# Altium footprint library MH_DA_THU_VIEN_16122016.PcbLib: 531 footprints (part 31 of 34)
Each footprint in its own frame and in the unit in brackets; x right, y up, seen from the top. Pads: shape width x height; smd on the part's side, far side on the other; paste and mask are expansions set on the pad; w line width, h text height; cw(c..) or ccw(c..) is an arc to the next point about the centre after c.
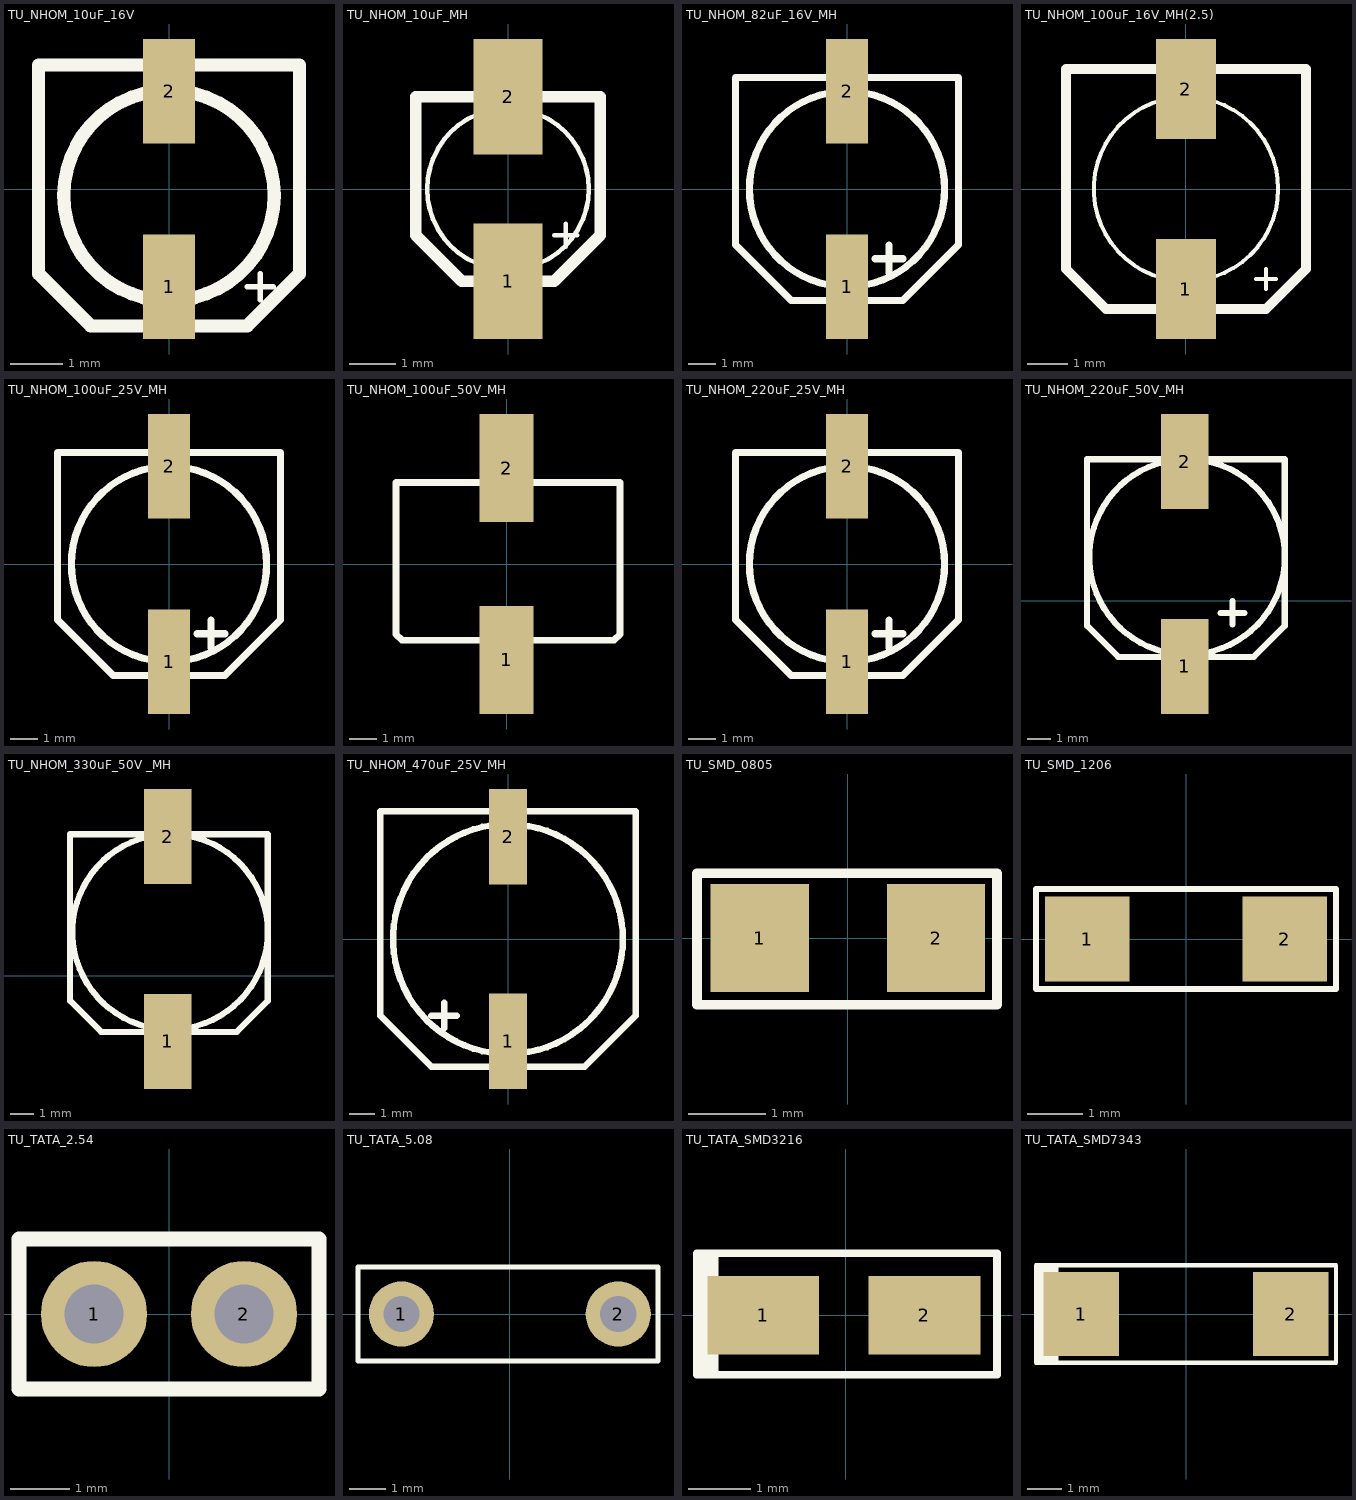
[diagram p30: the footprints below, top view; thin cyan lines are the x and y axes]

## TU_NHOM_10uF_16V [mm]
pads (2):
  rect 1x2 smd: 1(0,-1.875) 2(0,1.875)
Top Overlay:
  circle w0.254: c0,-0.125 r2.016
  lines w0.1: 1.5,-1.875 2,-1.875 ; 1.75,-2.125 1.75,-1.625
  lines w0.254: -2.5,-1.625 -2.5,2.375 2.5,2.375 2.5,-1.625 1.5,-2.625 -1.5,-2.625 -2.5,-1.625
3D body: height 5.4, standoff -0.05, extent -2.15,-2.625 2.15,2.375

## TU_NHOM_10uF_MH [mm]
pads (2):
  rect 1.5x2.5 smd: 1(0,-2) 2(0,2)
Top Overlay:
  circle w0.1: c0,0 r1.75
  lines w0.1: 1,-1 1.5,-1 ; 1.25,-1.25 1.25,-1 1.25,-0.75
  lines w0.254: -2,-1 -2,2 2,2 2,-1 1,-2 -1,-2 -2,-1
3D body: height 5.4, standoff -0.05, extent -2.15,-2.5 2.15,2.5

## TU_NHOM_82uF_16V_MH [mm]
pads (2):
  rect 1.5x3.75 smd: 1(0,-3.5) 2(0,3.5)
Top Overlay:
  circle w0.254: c0,0 r3.5
  lines w0.254: 1,-2.5 2,-2.5 ; 1.5,-3 1.5,-2 ; 2,-4 -2,-4 -4,-2 -4,4 4,4 4,-2 2,-4 ; 2,-4 2,-4
3D body: height 11.23, standoff -0.2, extent -4.15,-5 4.15,4

## TU_NHOM_100uF_16V_MH(2.5) [mm]
pads (2):
  rect 1.5x2.5 smd: 1(0,-2.5) 2(0,2.5)
Top Overlay:
  circle w0.1: c0,0 r2.305
  lines w0.1: 1.75,-2.25 2.25,-2.25 ; 2,-2.5 2,-2
  lines w0.254: -3,-2 -2,-3 2,-3 3,-2 3,3 -3,3 -3,-2
3D body: height 6, standoff 0, extent -3.25,-3.3 3.35,3.3

## TU_NHOM_100uF_25V_MH [mm]
pads (2):
  rect 1.5x3.75 smd: 1(0,-3.5) 2(0,3.5)
Top Overlay:
  circle w0.254: c0,0 r3.5
  lines w0.254: 1,-2.5 2,-2.5 ; 1.5,-3 1.5,-2 ; 2,-4 4,-2 4,4 -4,4 -4,-2 -2,-4 2,-4 ; 2,-4 2,-4
3D body: height 11.23, standoff -0.2, extent -4.15,-5 4.15,4

## TU_NHOM_100uF_50V_MH [mm]
pads (2):
  rect 2x4 smd: 1(0,-3.55) 2(0,3.551)
Top Overlay:
  lines w0.254: -4.1,-2.601 -4.1,-2.501 ; -4.1,-2.601 -3.881,-2.819 -0.971,-2.819 3.981,-2.819 4.2,-2.601 4.2,3.023 -4.1,3.023 -4.1,-2.501 ; -4.1,-2.601 -4.1,-2.501
3D body: height 7.9, standoff -0.05, extent -5.105,-5.652 5.195,5.348

## TU_NHOM_220uF_25V_MH [mm]
pads (2):
  rect 1.5x3.75 smd: 1(0,-3.5) 2(0,3.5)
Top Overlay:
  circle w0.254: c0,0 r3.5
  lines w0.254: 1,-2.5 2,-2.5 ; 1.5,-3 1.5,-2 ; 2,-4 -2,-4 -4,-2 -4,4 4,4 4,-2 2,-4 ; 2,-4 2,-4
3D body: height 11.23, standoff -0.2, extent -4.15,-5 4.15,4

## TU_NHOM_220uF_50V_MH [mm]
pads (2):
  rect 2x4 smd: 1(17.989,-2.751) 2(17.989,5.849)
Top Overlay:
  circle w0.254: c18.089,1.849 r4.105
  lines w0.254: 15.289,-2.351 15.189,-2.351 ; 19.5,-0.5 20.5,-0.5 ; 20,-1 20,0 ; 15.189,-2.351 20.889,-2.351 22.189,-1.051 22.189,5.949 13.889,5.949 13.889,-0.951 13.889,-1.051 15.189,-2.351
3D body: height 7.9, standoff -0.05, extent 12.803,-3.66 23.103,7.34

## TU_NHOM_330uF_50V _MH [mm]
pads (2):
  rect 2x4 smd: 1(17.989,-2.751) 2(17.989,5.849)
Top Overlay:
  circle w0.254: c18.089,1.849 r4.105
  lines w0.254: 15.289,-2.351 15.189,-2.351 ; 15.189,-2.351 20.889,-2.351 22.189,-1.051 22.189,5.949 13.889,5.949 13.889,-0.951 13.889,-1.051 15.189,-2.351
3D body: height 7.9, standoff -0.05, extent 12.803,-3.66 23.103,7.34

## TU_NHOM_470uF_25V_MH [mm]
pads (2):
  rect 1.5x3.75 smd: 1(0,-4) 2(0,4)
Top Overlay:
  circle w0.254: c0,0 r4.5
  lines w0.254: -3,-3 -2,-3 ; -2.5,-3.5 -2.5,-3 -2.5,-2.5 ; -3,-5 -5,-3 -5,5 5,5 5,-3 3,-5 ; -3,-5 3,-5 ; -3,-5 3,-5
3D body: height 7.9, standoff -0.05, extent -5.15,-5.5 5.15,5.5

## TU_SMD_0805 [mil]
height 50
pads (2):
  rect 50x55 smd: 1(-45,0) 2(45,0)
Top Overlay:
  lines w5: -77,-34 -77,33 76,33 76,-34 -77,-34
3D body: height 24.02, standoff -0.39, extent -39.76,-27 39.77,23

## TU_SMD_1206 [mil]
pads (2):
  rect 60x60 smd: 1(-70,0) 2(70,0)
Top Overlay:
  lines w3.94: -106.3,-35.43 -106.3,35.43 106.3,35.43 106.3,32.17 106.3,-35.43 -106.3,-35.43
3D body: height 40, standoff 0, extent -35,-35 35,35
3D body: height 39.45, standoff 0, extent -62.99,-31.49 63,31.5

## TU_TATA_2.54 [mm]
pads (2):
  round 1.8 hole 1: 1(-1.27,0) 2(1.27,0)
Top Overlay:
  lines w0.254: -2.54,-1.27 -2.54,1.27 2.54,1.27 2.54,-1.27 -2.54,-1.27
3D body: height 8.84, standoff -0.5, extent -1.905,-1.27 1.905,1.27

## TU_TATA_5.08 [mm]
pads (2):
  round 1.8 hole 1: 1(-3,0) 2(3,0)
Top Overlay:
  lines w0.127: -4.2,-1.3 -4.2,1.3 4.1,1.3 4.1,-1.3 -4.2,-1.3
3D body: height 6.27, standoff -0.47, extent -2.794,-1.159 2.794,1

## TU_TATA_SMD3216 [mm]
pads (2):
  rect 1.8x1.27 smd: 1(-1.33,0) 2(1.27,0)
Top Overlay:
  rectangle: -2.4,-0.96 -2.1,1
  lines w0.1: -2.1,-0.96 -2.1,1
  lines w0.127: -2.4,-0.96 2.44,-0.96 2.44,0.7 2.44,1 -2.4,1 -2.4,-0.96
3D body: height 1.7, standoff 0, extent -1.7,-0.9 1.7,0.9

## TU_TATA_SMD7343 [mm]
pads (2):
  rect 2.16x2.41 smd: 1(-3,0) 2(3,0)
Top Overlay:
  rectangle: -4.3,-1.4 -3.7,1.4
  lines w0.1: -3.7,-1.4 -3.7,1.4
  lines w0.127: -4.3,-1.4 4.3,-1.4 4.3,1.4 -4.3,1.4 -4.3,-1.4
3D body: height 4, standoff 0, extent -3.8,-2.3 3.8,2.3